# Altium footprint library TYCO THD.PcbLib: 146 footprints (part 3 of 11)
Each footprint in its own frame and in the unit in brackets; x right, y up, seen from the top. Pads: shape width x height; smd on the part's side, far side on the other; paste and mask are expansions set on the pad; w line width, h text height; cw(c..) or ccw(c..) is an arc to the next point about the centre after c.
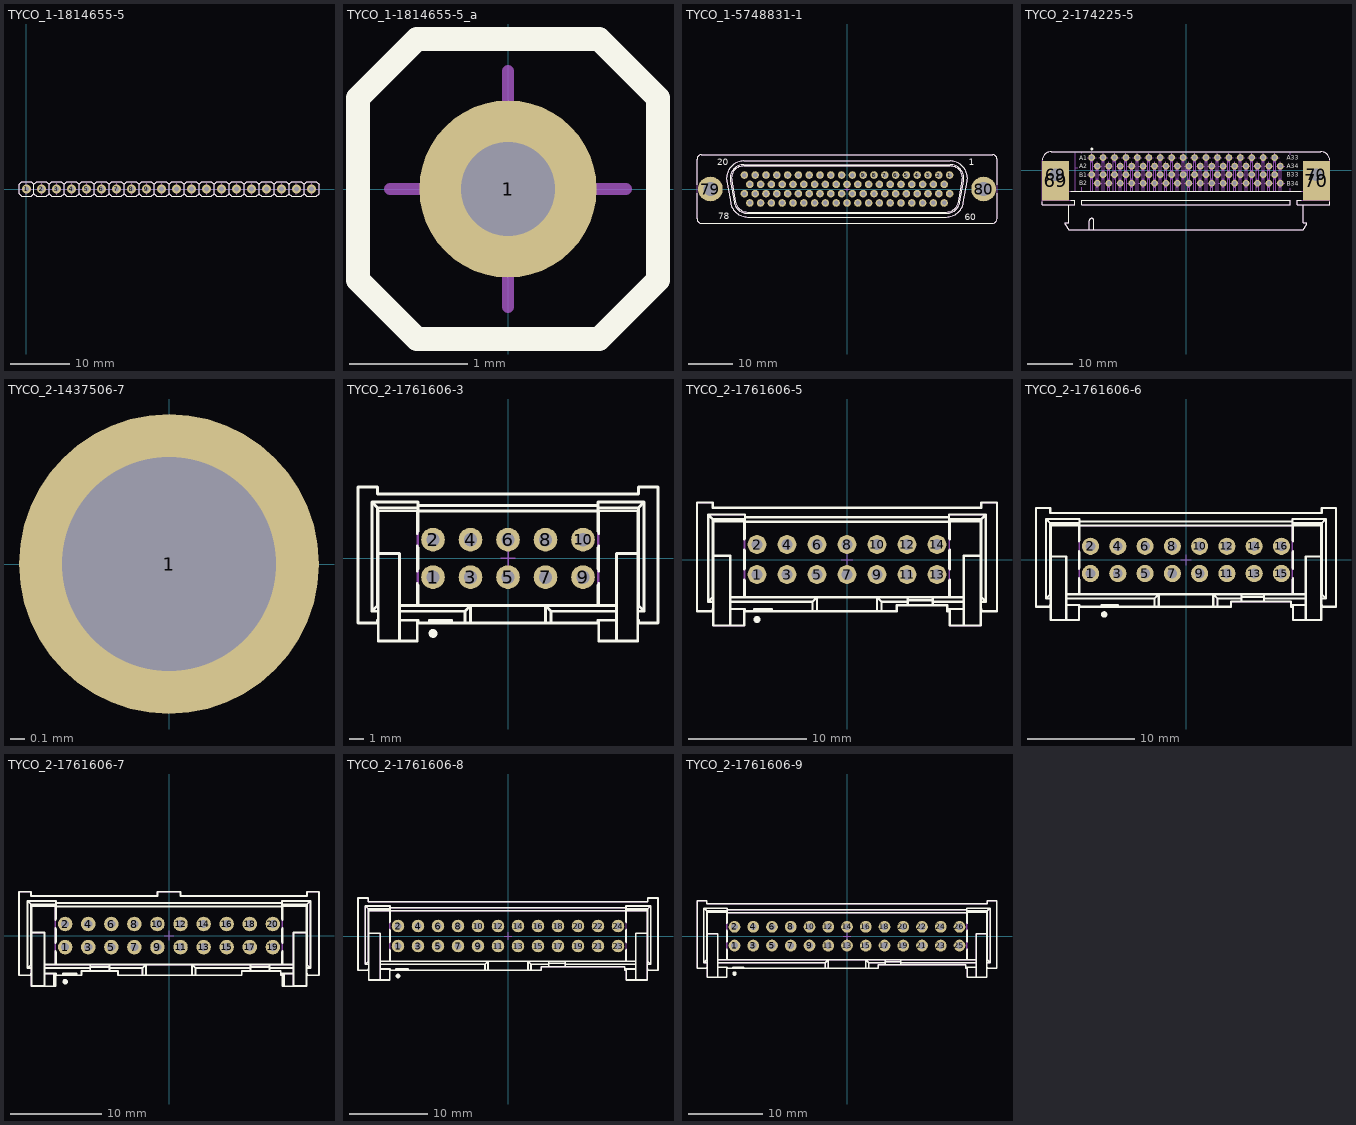
[diagram p2: the footprints below, top view; thin cyan lines are the x and y axes]

## TYCO_1-1814655-5 [mm] "20 Positions, Pitch 2.54mm, Width 2.54mm, Heigh 4.4mm, SIP Straight Socket"
height 4.4
pads (20):
  round 1.5 hole 0.8: 1(0,0) 2(2.54,0) 3(5.08,0) 4(7.62,0) 5(10.16,0) 6(12.7,0) 7(15.24,0) 8(17.78,0) 9(20.32,0) 10(22.86,0) 11(25.4,0) 12(27.94,0) 13(30.48,0) 14(33.02,0) 15(35.56,0) 16(38.1,0) 17(40.64,0) 18(43.18,0) 19(45.72,0) 20(48.26,0)
Top Overlay:
  lines w0.2: 1.27,-0.77 0.77,-1.27 -0.77,-1.27 -1.27,-0.77 -1.27,0.77 -0.77,1.27 0.77,1.27 1.27,0.77 ; 1.27,-0.77 1.77,-1.27 3.31,-1.27 3.81,-0.77 ; 1.27,-0.77 1.27,0.77 ; 1.27,0.77 1.77,1.27 3.31,1.27 3.81,0.77 ; 3.81,-0.77 4.31,-1.27 5.85,-1.27 6.35,-0.77 ; 3.81,-0.77 3.81,0.77 ; 3.81,0.77 4.31,1.27 5.85,1.27 6.35,0.77 ; 6.35,-0.77 6.85,-1.27 8.39,-1.27 8.89,-0.77 ; 6.35,-0.77 6.35,0.77 ; 6.35,0.77 6.85,1.27 8.39,1.27 8.89,0.77 ; 8.89,-0.77 9.39,-1.27 10.93,-1.27 11.43,-0.77 ; 8.89,-0.77 8.89,0.77 ; 8.89,0.77 9.39,1.27 10.93,1.27 11.43,0.77 ; 11.43,-0.77 11.93,-1.27 13.47,-1.27 13.97,-0.77 ; 11.43,-0.77 11.43,0.77 ; 11.43,0.77 11.93,1.27 13.47,1.27 13.97,0.77 ; 13.97,-0.77 14.47,-1.27 16.01,-1.27 16.51,-0.77 ; 13.97,-0.77 13.97,0.77 ; 13.97,0.77 14.47,1.27 16.01,1.27 16.51,0.77 ; 16.51,-0.77 17.01,-1.27 18.55,-1.27 19.05,-0.77 ; 16.51,-0.77 16.51,0.77 ; 16.51,0.77 17.01,1.27 18.55,1.27 19.05,0.77 ; 19.05,-0.77 19.55,-1.27 21.09,-1.27 21.59,-0.77 ; 19.05,-0.77 19.05,0.77 ; 19.05,0.77 19.55,1.27 21.09,1.27 21.59,0.77 ; 21.59,-0.77 22.09,-1.27 23.63,-1.27 24.13,-0.77 ; 21.59,-0.77 21.59,0.77 ; 21.59,0.77 22.09,1.27 23.63,1.27 24.13,0.77 ; 24.13,-0.77 24.63,-1.27 26.17,-1.27 26.67,-0.77 ; 24.13,-0.77 24.13,0.77 ; 24.13,0.77 24.63,1.27 26.17,1.27 26.67,0.77 ; 26.67,-0.77 26.67,0.77 ; 26.67,-0.77 27.17,-1.27 28.71,-1.27 29.21,-0.77 ; 26.67,0.77 27.17,1.27 28.71,1.27 29.21,0.77 ; 29.21,-0.77 29.21,0.77 ; 29.21,-0.77 29.71,-1.27 31.25,-1.27 31.75,-0.77 ; 29.21,0.77 29.71,1.27 31.25,1.27 31.75,0.77 ; 31.75,-0.77 31.75,0.77 ; 31.75,-0.77 32.25,-1.27 33.79,-1.27 34.29,-0.77 ; 31.75,0.77 32.25,1.27 33.79,1.27 34.29,0.77 ; 34.29,-0.77 34.79,-1.27 36.33,-1.27 36.83,-0.77 ; 34.29,-0.77 34.29,0.77 ; 34.29,0.77 34.79,1.27 36.33,1.27 36.83,0.77 ; 36.83,-0.77 37.33,-1.27 38.87,-1.27 39.37,-0.77 ; 36.83,-0.77 36.83,0.77 ; 36.83,0.77 37.33,1.27 38.87,1.27 39.37,0.77 ; 39.37,-0.77 39.37,0.77 ; 39.37,-0.77 39.87,-1.27 41.41,-1.27 41.91,-0.77 ; 39.37,0.77 39.87,1.27 41.41,1.27 41.91,0.77 ; 41.91,-0.77 42.41,-1.27 43.95,-1.27 44.45,-0.77 ; 41.91,-0.77 41.91,0.77 ; 41.91,0.77 42.41,1.27 43.95,1.27 44.45,0.77 ; 44.45,-0.77 44.45,0.77 ; 44.45,-0.77 44.95,-1.27 46.49,-1.27 46.99,-0.77 ; 44.45,0.77 44.95,1.27 46.49,1.27 46.99,0.77 ; 46.99,-0.77 46.99,0.77 ; 46.99,-0.77 47.49,-1.27 49.03,-1.27 49.53,-0.77 49.53,0.77 49.03,1.27 47.49,1.27 46.99,0.77
Mechanical 8:
  lines w0.1: -1,0 0,0 ; 0,-1 0,0 ; 0,1 0,0 ; 1,0 0,0 ; 1.54,0 2.54,0 ; 2.54,-1 2.54,0 ; 2.54,1 2.54,0 ; 3.54,0 2.54,0 ; 4.08,0 5.08,0 ; 5.08,-1 5.08,0 ; 5.08,1 5.08,0 ; 6.08,0 5.08,0 ; 6.62,0 7.62,0 ; 7.62,-1 7.62,0 ; 7.62,1 7.62,0 ; 8.62,0 7.62,0 ; 9.16,0 10.16,0 ; 10.16,-1 10.16,0 ; 10.16,1 10.16,0 ; 11.16,0 10.16,0 ; 11.7,0 12.7,0 ; 12.7,-1 12.7,0 ; 12.7,1 12.7,0 ; 13.7,0 12.7,0 ; 14.24,0 15.24,0 ; 15.24,-1 15.24,0 ; 15.24,1 15.24,0 ; 16.24,0 15.24,0 ; 16.78,0 17.78,0 ; 17.78,-1 17.78,0 ; 17.78,1 17.78,0 ; 18.78,0 17.78,0 ; 19.32,0 20.32,0 ; 20.32,-1 20.32,0 ; 20.32,1 20.32,0 ; 21.32,0 20.32,0 ; 21.86,0 22.86,0 ; 22.86,-1 22.86,0 ; 22.86,1 22.86,0 ; 23.86,0 22.86,0 ; 24.4,0 25.4,0 ; 25.4,-1 25.4,0 ; 25.4,1 25.4,0 ; 26.4,0 25.4,0 ; 26.94,0 27.94,0 ; 27.94,-1 27.94,0 ; 27.94,1 27.94,0 ; 28.94,0 27.94,0 ; 29.48,0 30.48,0 ; 30.48,-1 30.48,0 ; 30.48,1 30.48,0 ; 31.48,0 30.48,0 ; 32.02,0 33.02,0 ; 33.02,-1 33.02,0 ; 33.02,1 33.02,0 ; 34.02,0 33.02,0 ; 34.56,0 35.56,0 ; 35.56,-1 35.56,0 ; 35.56,1 35.56,0 ; 36.56,0 35.56,0 ; 37.1,0 38.1,0 ; 38.1,-1 38.1,0 ; 38.1,1 38.1,0 ; 39.1,0 38.1,0 ; 39.64,0 40.64,0 ; 40.64,-1 40.64,0 ; 40.64,1 40.64,0 ; 41.64,0 40.64,0 ; 42.18,0 43.18,0 ; 43.18,-1 43.18,0 ; 43.18,1 43.18,0 ; 44.18,0 43.18,0 ; 44.72,0 45.72,0 ; 45.72,-1 45.72,0 ; 45.72,1 45.72,0 ; 46.72,0 45.72,0 ; 47.26,0 48.26,0 ; 48.26,-1 48.26,0 ; 48.26,1 48.26,0 ; 49.26,0 48.26,0
Mechanical 14:
  lines w0.1: 1.27,-0.77 0.77,-1.27 -0.77,-1.27 -1.27,-0.77 -1.27,0.77 -0.77,1.27 0.77,1.27 1.27,0.77 ; 1.27,-0.77 1.77,-1.27 3.31,-1.27 3.81,-0.77 ; 1.27,-0.77 1.27,0.77 ; 1.27,0.77 1.77,1.27 3.31,1.27 3.81,0.77 ; 3.81,-0.77 4.31,-1.27 5.85,-1.27 6.35,-0.77 ; 3.81,-0.77 3.81,0.77 ; 3.81,0.77 4.31,1.27 5.85,1.27 6.35,0.77 ; 6.35,-0.77 6.85,-1.27 8.39,-1.27 8.89,-0.77 ; 6.35,-0.77 6.35,0.77 ; 6.35,0.77 6.85,1.27 8.39,1.27 8.89,0.77 ; 8.89,-0.77 9.39,-1.27 10.93,-1.27 11.43,-0.77 ; 8.89,-0.77 8.89,0.77 ; 8.89,0.77 9.39,1.27 10.93,1.27 11.43,0.77 ; 11.43,-0.77 11.93,-1.27 13.47,-1.27 13.97,-0.77 ; 11.43,-0.77 11.43,0.77 ; 11.43,0.77 11.93,1.27 13.47,1.27 13.97,0.77 ; 13.97,-0.77 14.47,-1.27 16.01,-1.27 16.51,-0.77 ; 13.97,-0.77 13.97,0.77 ; 13.97,0.77 14.47,1.27 16.01,1.27 16.51,0.77 ; 16.51,-0.77 17.01,-1.27 18.55,-1.27 19.05,-0.77 ; 16.51,-0.77 16.51,0.77 ; 16.51,0.77 17.01,1.27 18.55,1.27 19.05,0.77 ; 19.05,-0.77 19.55,-1.27 21.09,-1.27 21.59,-0.77 ; 19.05,-0.77 19.05,0.77 ; 19.05,0.77 19.55,1.27 21.09,1.27 21.59,0.77 ; 21.59,-0.77 22.09,-1.27 23.63,-1.27 24.13,-0.77 ; 21.59,-0.77 21.59,0.77 ; 21.59,0.77 22.09,1.27 23.63,1.27 24.13,0.77 ; 24.13,-0.77 24.63,-1.27 26.17,-1.27 26.67,-0.77 ; 24.13,-0.77 24.13,0.77 ; 24.13,0.77 24.63,1.27 26.17,1.27 26.67,0.77 ; 26.67,-0.77 26.67,0.77 ; 26.67,-0.77 27.17,-1.27 28.71,-1.27 29.21,-0.77 ; 26.67,0.77 27.17,1.27 28.71,1.27 29.21,0.77 ; 29.21,-0.77 29.21,0.77 ; 29.21,-0.77 29.71,-1.27 31.25,-1.27 31.75,-0.77 ; 29.21,0.77 29.71,1.27 31.25,1.27 31.75,0.77 ; 31.75,-0.77 31.75,0.77 ; 31.75,-0.77 32.25,-1.27 33.79,-1.27 34.29,-0.77 ; 31.75,0.77 32.25,1.27 33.79,1.27 34.29,0.77 ; 34.29,-0.77 34.79,-1.27 36.33,-1.27 36.83,-0.77 ; 34.29,-0.77 34.29,0.77 ; 34.29,0.77 34.79,1.27 36.33,1.27 36.83,0.77 ; 36.83,-0.77 37.33,-1.27 38.87,-1.27 39.37,-0.77 ; 36.83,-0.77 36.83,0.77 ; 36.83,0.77 37.33,1.27 38.87,1.27 39.37,0.77 ; 39.37,-0.77 39.37,0.77 ; 39.37,-0.77 39.87,-1.27 41.41,-1.27 41.91,-0.77 ; 39.37,0.77 39.87,1.27 41.41,1.27 41.91,0.77 ; 41.91,-0.77 42.41,-1.27 43.95,-1.27 44.45,-0.77 ; 41.91,-0.77 41.91,0.77 ; 41.91,0.77 42.41,1.27 43.95,1.27 44.45,0.77 ; 44.45,-0.77 44.45,0.77 ; 44.45,-0.77 44.95,-1.27 46.49,-1.27 46.99,-0.77 ; 44.45,0.77 44.95,1.27 46.49,1.27 46.99,0.77 ; 46.99,-0.77 46.99,0.77 ; 46.99,-0.77 47.49,-1.27 49.03,-1.27 49.53,-0.77 49.53,0.77 49.03,1.27 47.49,1.27 46.99,0.77
3D body "TYCO_1-1814655-5.stp": height 4.4, standoff -2.9, extent -1.27,-1.27 49.53,1.27

## TYCO_1-1814655-5_a [mm] "1 of 20 Positions, Pitch 2.54mm, Width 2.54mm, Heigh 4.4mm, SIP Straight Socket"
height 4.4
pads (1):
  round 1.5 hole 0.8: 1(0,0)
Top Overlay:
  lines w0.2: -1.27,-0.77 -1.27,0.77 -0.77,1.27 0.77,1.27 1.27,0.77 1.27,-0.77 0.77,-1.27 -0.77,-1.27 -1.27,-0.77
Mechanical 8:
  lines w0.1: -1,0 0,0 ; 0,-1 0,0 ; 0,1 0,0 ; 1,0 0,0
Mechanical 14:
  lines w0.1: -1.27,-0.77 -1.27,0.77 -0.77,1.27 0.77,1.27 1.27,0.77 1.27,-0.77 0.77,-1.27 -0.77,-1.27 -1.27,-0.77
3D body "TYCO_1-1814655-5_a.stp": height 4.4, standoff -2.9, extent -1.27,-1.27 1.27,1.27

## TYCO_1-5748831-1 [mm] "Straight D-SUB 78 Female Contacts, Shell Size 5, With Boardlock and Threaded Insert,(4-40 UNC), HD-22 Serie"
height 12.48
pads (80):
  round 1.7 hole 1: 1(22.914,3.12) 2(20.502,3.12) 3(18.09,3.12) 4(15.678,3.12) 5(13.266,3.12) 6(10.854,3.12) 7(8.442,3.12) 8(6.03,3.12) 9(3.618,3.12) 10(1.206,3.12) 11(-1.206,3.12) 12(-3.618,3.12) 13(-6.03,3.12) 14(-8.442,3.12) 15(-10.854,3.12) 16(-13.266,3.12) 17(-15.678,3.12) 18(-18.09,3.12) 19(-20.502,3.12) 20(-22.914,3.12) 21(21.708,1.04) 22(19.296,1.04) 23(16.884,1.04) 24(14.472,1.04) 25(12.06,1.04) 26(9.648,1.04) 27(7.236,1.04) 28(4.824,1.04) 29(2.412,1.04) 30(0,1.04) 31(-2.412,1.04) 32(-4.824,1.04) 33(-7.236,1.04) 34(-9.648,1.04) 35(-12.06,1.04) 36(-14.472,1.04) 37(-16.884,1.04) 38(-19.296,1.04) 39(-21.708,1.04) 40(22.914,-1.04) 41(20.502,-1.04) 42(18.09,-1.04) 43(15.678,-1.04) 44(13.266,-1.04) 45(10.854,-1.04) 46(8.442,-1.04) 47(6.03,-1.04) 48(3.618,-1.04) 49(1.206,-1.04) 50(-1.206,-1.04) 51(-3.618,-1.04) 52(-6.03,-1.04) 53(-8.442,-1.04) 54(-10.854,-1.04) 55(-13.266,-1.04) 56(-15.678,-1.04) 57(-18.09,-1.04) 58(-20.502,-1.04) 59(-22.914,-1.04) 60(21.708,-3.12) 61(19.296,-3.12) 62(16.884,-3.12) 63(14.472,-3.12) 64(12.06,-3.12) 65(9.648,-3.12) 66(7.236,-3.12) 67(4.824,-3.12) 68(2.412,-3.12) 69(0,-3.12) 70(-2.412,-3.12) 71(-4.824,-3.12) 72(-7.236,-3.12) 73(-9.648,-3.12) 74(-12.06,-3.12) 75(-14.472,-3.12) 76(-16.884,-3.12) 77(-19.296,-3.12) 78(-21.708,-3.12)
  round 5.5 hole 3.1: 79(-30.5,0) 80(30.5,0)
Top Overlay:
  lines w0.2: -33.5,-0.96 -33.5,-6.65 ccw(c-32.5,-6.65) -32.5,-7.65 32.5,-7.65 ccw(c32.5,-6.65) 33.5,-6.65 33.5,-0.96 ; -33.5,0.96 -33.5,6.65 cw(c-32.5,6.65) -32.5,7.65 32.5,7.65 cw(c32.5,6.65) 33.5,6.65 33.5,0.96 ; -26.913,2.402 cw(c-23.052,2.402) -23.052,6.263 23.052,6.263 cw(c23.052,2.402) 26.854,1.732 26.007,-3.072 cw(c22.205,-2.402) 22.205,-6.263 -22.205,-6.263 cw(c-22.205,-2.402) -26.007,-3.072 -26.913,2.402 ; -26.054,1.873 cw(c-23.052,2.402) -23.052,5.45 23.052,5.45 cw(c23.052,2.402) 26.054,1.873 25.219,-2.933 cw(c22.195,-2.376) 22.205,-5.45 -22.205,-5.45 cw(c-22.205,-2.402) -25.207,-2.931 -26.054,1.873 ; -25.758,1.925 cw(c-23.052,2.402) -23.052,5.15 23.052,5.15 cw(c23.052,2.402) 25.758,1.925 24.911,-2.879 cw(c22.205,-2.402) 22.205,-5.15 -22.205,-5.15 cw(c-22.205,-2.402) -24.911,-2.879 -25.758,1.925
  text "60" at 26.271,-6.927 h1.5
  text "1" at 27.146,5.263 h1.5
  text "78" at -28.704,-6.715 h1.5
  text "20" at -28.929,5.348 h1.5
Mechanical 8:
  drawing of 168 lines, arcs and shapes, not listed
Mechanical 14:
  drawing of 196 lines, arcs and shapes, not listed
  text "1" at 27.146,5.263 h1.5
  text "60" at 26.271,-6.927 h1.5
  text "78" at -28.704,-6.715 h1.5
  text "20" at -28.929,5.348 h1.5
3D body "TYCO_1-5748831-1.stp": height 12.1, standoff -3.18, extent -33.5,-7.65 33.5,7.65

## TYCO_2-174225-5 [mm] "68 contacts, AMPLIMITE .050\", Right Angled Header  Series 2 Type B (Threaded  M2.5)"
height 9.5
pads (72):
  rect 6x8.705 smd paste-3: 69(-28.955,-2.305) 70(28.955,-2.305)
  round 5.5 hole 2.8: 69(-28.955,-0.953) 70(28.955,-0.953)
  round 1.5 hole 0.9: A1(-20.955,2.858) A2(-19.685,0.953) A3(-18.415,2.858) A4(-17.145,0.953) A5(-15.875,2.858) A6(-14.605,0.953) A7(-13.335,2.858) A8(-12.065,0.952) A9(-10.795,2.858) A10(-9.525,0.953) A11(-8.255,2.858) A12(-6.985,0.953) A13(-5.715,2.858) A14(-4.445,0.953) A15(-3.175,2.858) A16(-1.905,0.953) A17(-0.635,2.858) A18(0.635,0.953) A19(1.905,2.858) A20(3.175,0.953) A21(4.445,2.858) A22(5.715,0.953) A23(6.985,2.858) A24(8.255,0.953) A25(9.525,2.858) A26(10.795,0.953) A27(12.065,2.858) A28(13.335,0.953) A29(14.605,2.858) A30(15.875,0.953) A31(17.145,2.858) A32(18.415,0.953) A33(19.685,2.858) A34(20.955,0.953) B1(-20.955,-0.953) B2(-19.685,-2.858) B3(-18.415,-0.953) B4(-17.145,-2.858) B5(-15.875,-0.953) B6(-14.605,-2.858) B7(-13.335,-0.953) B8(-12.065,-2.858) B9(-10.795,-0.953) B10(-9.525,-2.858) B11(-8.255,-0.953) B12(-6.985,-2.858) B13(-5.715,-0.953) B14(-4.445,-2.858) B15(-3.175,-0.953) B16(-1.905,-2.858) B17(-0.635,-0.953) B18(0.635,-2.858) B19(1.905,-0.953) B20(3.175,-2.858) B21(4.445,-0.953) B22(5.715,-2.858) B23(6.985,-0.953) B24(8.255,-2.858) B25(9.525,-0.953) B26(10.795,-2.858) B27(12.065,-0.953) B28(13.335,-2.858) B29(14.605,-0.953) B30(15.875,-2.858) B31(17.145,-0.953) B32(18.415,-2.858) B33(19.685,-0.953) B34(20.955,-2.858)
Top Overlay:
  circle w0.3: c-20.9,4.75 r0.15
  lines w0.2: -31.955,-7.007 -31.955,-7.658 -24.69,-7.658 -24.69,-6.658 -25.605,-6.658 ; -31.939,2.398 cw(c-29.955,2.143) -29.955,4.143 29.955,4.143 cw(c29.955,2.143) 31.939,2.398 ; -26.055,-7.658 -26.055,-11.658 -26.855,-11.658 -26.855,-11.957 -26.055,-13.157 26.055,-13.157 26.855,-11.957 26.855,-11.658 26.055,-11.658 26.055,-7.658 ; -25.605,-4.657 25.605,-4.657 ; -21.455,-13.157 -21.455,-11.158 cw(c-20.955,-11.158) -20.455,-11.158 -20.455,-13.157 ; 25.605,-6.658 24.69,-6.658 24.69,-7.658 31.955,-7.658 31.955,-7.007 ; -23.14,-7.658 -23.14,-6.658 23.14,-6.658 23.14,-7.658 -23.14,-7.658
  text "A34" at 22.4,0.485 h1
  text "B33" at 22.4,-1.415 h1
  text "B34" at 22.4,-3.365 h1
  text "A33" at 22.4,2.335 h1
  text "B2" at -23.65,-3.25 h1
  text "A1" at -23.65,2.25 h1
  text "A2" at -23.65,0.5 h1
  text "B1" at -23.65,-1.5 h1
Mechanical 8:
  drawing of 284 lines, arcs and shapes, not listed
Mechanical 14:
  drawing of 174 lines, arcs and shapes, not listed
  text "A34" at 22.4,0.485 h1.02
  text "B33" at 22.4,-1.415 h1.02
  text "B34" at 22.4,-3.365 h1.02
  text "A33" at 22.4,2.335 h1.02
  text "B2" at -23.65,-3.25 h1.02
  text "A1" at -23.65,2.25 h1.02
  text "A2" at -23.65,0.5 h1.02
  text "B1" at -23.65,-1.5 h1.02
3D body "TYCO_2-174225-5.stp": height 9.5, standoff -2.9, extent -31.955,-13.157 31.955,4.143

## TYCO_2-1437506-7 [mm] "HOLTITE Socket (Mating Pin Dia. Range 0.64 to 0.89mm)"
height 3.56
pads (1):
  round 2.1 hole 1.5: 1(0,0)
Mechanical 14:
  circle w0.1: c0,0 r0.737
  circle w0.1: c0,0.006 r0.368
3D body "TYCO_7-1437514-0.stp": height 0, standoff -3.45, extent -0.736,-0.736 0.737,0.737

## TYCO_2-1761606-3 [mm] "10 Contacts, Vertical Low Profile IDC Shrouded Header, with Long Eject Latch"
height 22.86
pads (10):
  round 1.6 hole 0.9: 1(-5.08,-1.27) 2(-5.08,1.27) 3(-2.54,-1.27) 4(-2.54,1.27) 5(0,-1.27) 6(0,1.27) 7(2.54,-1.27) 8(2.54,1.27) 9(5.08,-1.27) 10(5.08,1.27)
Top Overlay:
  circle w0.3: c-5.08,-5.08 r0.15
  lines w0.2: -8.788,-4.191 -8.839,-4.191 -8.839,-4.369 -10.16,-4.369 -10.16,4.826 -8.839,4.826 -8.839,4.369 8.839,4.369 8.839,4.826 10.16,4.826 10.16,-4.369 8.839,-4.369 8.839,-4.191 8.788,-4.191 ; -8.788,-3.581 -9.22,-3.581 ; -8.788,-3.2 -8.839,-3.2 ; -8.788,0.33 -7.341,0.33 -7.341,-5.588 ; -7.341,-4.191 -6.096,-4.191 -6.096,-4.369 6.096,-4.369 6.096,-4.191 7.341,-4.191 ; -7.341,-3.581 -2.921,-3.581 ; -7.341,-3.2 7.341,-3.2 ; -6.147,-4.191 -6.147,-5.588 -8.788,-5.588 -8.788,3.226 -6.147,3.226 -6.147,1.699 ; -6.147,-3.2 -6.147,-1.7 ; -6.147,-0.841 -6.147,0.84 ; -6.096,-3.2 -6.096,-1.809 ; -6.096,-0.731 -6.096,0.731 ; -6.096,1.809 -6.096,3.81 -9.22,3.81 ; -6.096,3.2 6.096,3.2 ; -6.096,3.429 -8.839,3.429 ; -6.096,3.581 6.096,3.581 ; -5.334,-4.369 -5.334,-4.191 -3.81,-4.191 -3.81,-4.369 ; -2.921,-4.369 -2.921,-3.581 ; -2.54,-4.369 -2.54,-3.2 -2.921,-3.581 ; 2.54,-4.369 2.54,-3.2 2.921,-3.581 ; 2.921,-4.369 2.921,-3.581 ; 6.096,-3.2 6.096,-1.809 ; 6.096,-0.731 6.096,0.731 ; 6.096,1.809 6.096,3.81 9.22,3.81 ; 6.096,3.429 8.839,3.429 ; 6.147,-4.191 6.147,-5.588 8.788,-5.588 8.788,3.226 6.147,3.226 6.147,1.699 ; 6.147,-3.2 6.147,-1.7 ; 6.147,-0.841 6.147,0.84 ; 7.341,-5.588 7.341,0.33 8.788,0.33 ; 7.341,-3.581 2.921,-3.581 ; 8.788,-3.581 9.22,-3.581 ; 8.788,-3.2 8.839,-3.2 ; -9.22,-3.581 -9.22,3.81 ; -9.22,-3.581 -8.839,-3.2 ; -9.22,3.81 -8.839,3.429 ; -8.839,-3.2 -8.839,3.429 ; 8.839,-3.2 8.839,3.429 ; 8.839,-3.2 9.22,-3.581 ; 8.839,3.429 9.22,3.81 ; 9.22,-3.581 9.22,3.81
Mechanical 8:
  lines w0.1: -5.58,-1.27 -5.08,-1.27 ; -5.58,1.27 -5.08,1.27 ; -5.08,-1.77 -5.08,-1.27 ; -5.08,-0.77 -5.08,-1.27 ; -5.08,0.77 -5.08,1.27 ; -5.08,1.77 -5.08,1.27 ; -4.58,-1.27 -5.08,-1.27 ; -4.58,1.27 -5.08,1.27 ; -3.04,-1.27 -2.54,-1.27 ; -3.04,1.27 -2.54,1.27 ; -2.54,-1.77 -2.54,-1.27 ; -2.54,-0.77 -2.54,-1.27 ; -2.54,0.77 -2.54,1.27 ; -2.54,1.77 -2.54,1.27 ; -2.04,-1.27 -2.54,-1.27 ; -2.04,1.27 -2.54,1.27 ; -0.5,-1.27 0,-1.27 ; -0.5,0 0,0 ; -0.5,1.27 0,1.27 ; 0,-1.77 0,-1.27 ; 0,-0.77 0,-1.27 ; 0,-0.5 0,0 ; 0,0.5 0,0 ; 0,0.77 0,1.27 ; 0,1.77 0,1.27 ; 0.5,-1.27 0,-1.27 ; 0.5,0 0,0 ; 0.5,1.27 0,1.27 ; 2.04,-1.27 2.54,-1.27 ; 2.04,1.27 2.54,1.27 ; 2.54,-1.77 2.54,-1.27 ; 2.54,-0.77 2.54,-1.27 ; 2.54,0.77 2.54,1.27 ; 2.54,1.77 2.54,1.27 ; 3.04,-1.27 2.54,-1.27 ; 3.04,1.27 2.54,1.27 ; 4.58,-1.27 5.08,-1.27 ; 4.58,1.27 5.08,1.27 ; 5.08,-1.77 5.08,-1.27 ; 5.08,-0.77 5.08,-1.27 ; 5.08,0.77 5.08,1.27 ; 5.08,1.77 5.08,1.27 ; 5.58,-1.27 5.08,-1.27 ; 5.58,1.27 5.08,1.27
Mechanical 14:
  lines w0.1: -8.788,-4.191 -8.839,-4.191 -8.839,-4.369 -10.16,-4.369 -10.16,4.826 -8.839,4.826 -8.839,4.369 8.839,4.369 8.839,4.826 10.16,4.826 10.16,-4.369 8.839,-4.369 8.839,-4.191 8.788,-4.191 ; -8.788,-3.581 -9.22,-3.581 ; -8.788,-3.2 -8.839,-3.2 ; -8.788,0.33 -7.341,0.33 -7.341,-5.588 ; -7.341,-4.191 -6.096,-4.191 -6.096,-4.369 6.096,-4.369 6.096,-4.191 7.341,-4.191 ; -7.341,-3.581 -2.921,-3.581 ; -7.341,-3.2 7.341,-3.2 ; -6.147,-4.191 -6.147,-5.588 -8.788,-5.588 -8.788,3.226 -6.147,3.226 -6.147,-3.2 ; -6.096,-3.2 -6.096,3.81 -9.22,3.81 ; -6.096,3.2 6.096,3.2 ; -6.096,3.429 -8.839,3.429 ; -6.096,3.581 6.096,3.581 ; -5.334,-4.369 -5.334,-4.191 -3.81,-4.191 -3.81,-4.369 ; -2.921,-4.369 -2.921,-3.581 ; -2.54,-4.369 -2.54,-3.2 -2.921,-3.581 ; 2.54,-4.369 2.54,-3.2 2.921,-3.581 ; 2.921,-4.369 2.921,-3.581 ; 6.096,-3.2 6.096,3.81 9.22,3.81 ; 6.096,3.429 8.839,3.429 ; 6.147,-4.191 6.147,-5.588 8.788,-5.588 8.788,3.226 6.147,3.226 6.147,-3.2 ; 7.341,-5.588 7.341,0.33 8.788,0.33 ; 7.341,-3.581 2.921,-3.581 ; 8.788,-3.581 9.22,-3.581 ; 8.788,-3.2 8.839,-3.2 ; -9.22,-3.581 -9.22,3.81 ; -9.22,-3.581 -8.839,-3.2 ; -9.22,3.81 -8.839,3.429 ; -8.839,-3.2 -8.839,3.429 ; 8.839,-3.2 8.839,3.429 ; 8.839,-3.2 9.22,-3.581 ; 8.839,3.429 9.22,3.81 ; 9.22,-3.581 9.22,3.81 ; -5.398,-1.588 -5.398,-0.953 -4.763,-0.953 -4.763,-1.588 -5.398,-1.588 ; -5.398,0.952 -4.763,0.952 -4.763,1.587 -5.398,1.587 -5.398,0.952 ; -2.858,-1.588 -2.858,-0.953 -2.223,-0.953 -2.223,-1.588 -2.858,-1.588 ; -2.858,0.952 -2.223,0.952 -2.223,1.587 -2.858,1.587 -2.858,0.952 ; -0.318,-1.588 -0.318,-0.953 0.317,-0.953 0.317,-1.588 -0.318,-1.588 ; -0.318,0.952 0.317,0.952 0.317,1.587 -0.318,1.587 -0.318,0.952 ; 2.222,-1.588 2.222,-0.953 2.857,-0.953 2.857,-1.588 2.222,-1.588 ; 2.222,0.952 2.857,0.952 2.857,1.587 2.222,1.587 2.222,0.952 ; 4.762,-1.588 4.762,-0.953 5.397,-0.953 5.397,-1.588 4.762,-1.588 ; 4.762,0.952 5.397,0.952 5.397,1.587 4.762,1.587 4.762,0.952
3D body "TYCO_2-1761606-3.stp": height 22.55, standoff -2.59, extent -10.16,-5.588 10.16,4.826

## TYCO_2-1761606-5 [mm] "14 Contacts, Vertical Low Profile IDC Shrouded Header, with Long Eject Latch"
height 22.86
pads (14):
  round 1.6 hole 0.9: 1(-7.62,-1.27) 2(-7.62,1.27) 3(-5.08,-1.27) 4(-5.08,1.27) 5(-2.54,-1.27) 6(-2.54,1.27) 7(0,-1.27) 8(0,1.27) 9(2.54,-1.27) 10(2.54,1.27) 11(5.08,-1.27) 12(5.08,1.27) 13(7.62,-1.27) 14(7.62,1.27)
Top Overlay:
  circle w0.3: c-7.62,-5.08 r0.15
  lines w0.2: -11.328,-4.191 -11.379,-4.191 -11.379,-4.369 -12.7,-4.369 -12.7,4.826 -11.379,4.826 -11.379,4.369 11.379,4.369 11.379,4.826 12.7,4.826 12.7,-4.369 11.379,-4.369 11.379,-4.191 11.328,-4.191 ; -11.328,-3.581 -11.76,-3.581 ; -11.328,-3.2 -11.379,-3.2 ; -11.328,0.33 -9.881,0.33 -9.881,-5.588 ; -9.881,-4.191 -8.636,-4.191 -8.636,-4.369 4.204,-4.369 4.204,-3.886 8.496,-3.886 8.496,-4.369 8.636,-4.369 8.636,-4.191 9.881,-4.191 ; -9.881,-3.581 -2.921,-3.581 ; -9.881,-3.2 9.881,-3.2 ; -8.687,-4.191 -8.687,-5.588 -11.328,-5.588 -11.328,3.226 -8.687,3.226 -8.687,1.699 ; -8.687,-3.2 -8.687,-1.699 ; -8.687,-0.841 -8.687,0.841 ; -8.636,-3.2 -8.636,-1.809 ; -8.636,-0.731 -8.636,0.731 ; -8.636,1.809 -8.636,3.81 -11.76,3.81 ; -8.636,3.2 8.636,3.2 ; -8.636,3.429 -11.379,3.429 ; -8.636,3.581 8.636,3.581 ; -7.874,-4.369 -7.874,-4.191 -6.35,-4.191 -6.35,-4.369 ; -2.921,-4.369 -2.921,-3.581 ; -2.54,-4.369 -2.54,-3.2 -2.921,-3.581 ; 2.54,-4.369 2.54,-3.2 2.921,-3.581 ; 2.921,-4.369 2.921,-3.581 ; 5.156,-3.886 5.156,-3.2 ; 5.156,-3.581 2.921,-3.581 ; 5.156,-3.454 7.264,-3.454 ; 7.264,-3.886 7.264,-3.2 ; 7.264,-3.581 9.881,-3.581 ; 8.636,-3.2 8.636,-1.809 ; 8.636,-0.731 8.636,0.731 ; 8.636,1.809 8.636,3.81 11.76,3.81 ; 8.636,3.429 11.379,3.429 ; 8.687,-4.191 8.687,-5.588 11.328,-5.588 11.328,3.226 8.687,3.226 8.687,1.699 ; 8.687,-3.2 8.687,-1.699 ; 8.687,-0.841 8.687,0.841 ; 9.881,-5.588 9.881,0.33 11.328,0.33 ; 11.328,-3.581 11.76,-3.581 ; 11.328,-3.2 11.379,-3.2 ; -11.76,-3.581 -11.379,-3.2 ; -11.76,-3.581 -11.76,3.81 ; -11.76,3.81 -11.379,3.429 ; -11.379,-3.2 -11.379,3.429 ; 11.379,-3.2 11.379,3.429 ; 11.379,-3.2 11.76,-3.581 ; 11.379,3.429 11.76,3.81 ; 11.76,-3.581 11.76,3.81
Mechanical 8:
  lines w0.1: -8.12,-1.27 -7.62,-1.27 ; -8.12,1.27 -7.62,1.27 ; -7.62,-1.77 -7.62,-1.27 ; -7.62,-0.77 -7.62,-1.27 ; -7.62,0.77 -7.62,1.27 ; -7.62,1.77 -7.62,1.27 ; -7.12,-1.27 -7.62,-1.27 ; -7.12,1.27 -7.62,1.27 ; -5.58,-1.27 -5.08,-1.27 ; -5.58,1.27 -5.08,1.27 ; -5.08,-1.77 -5.08,-1.27 ; -5.08,-0.77 -5.08,-1.27 ; -5.08,0.77 -5.08,1.27 ; -5.08,1.77 -5.08,1.27 ; -4.58,-1.27 -5.08,-1.27 ; -4.58,1.27 -5.08,1.27 ; -3.04,-1.27 -2.54,-1.27 ; -3.04,1.27 -2.54,1.27 ; -2.54,-1.77 -2.54,-1.27 ; -2.54,-0.77 -2.54,-1.27 ; -2.54,0.77 -2.54,1.27 ; -2.54,1.77 -2.54,1.27 ; -2.04,-1.27 -2.54,-1.27 ; -2.04,1.27 -2.54,1.27 ; -0.5,-1.27 0,-1.27 ; -0.5,0 0,0 ; -0.5,1.27 0,1.27 ; 0,-1.77 0,-1.27 ; 0,-0.77 0,-1.27 ; 0,-0.5 0,0 ; 0,0.5 0,0 ; 0,0.77 0,1.27 ; 0,1.77 0,1.27 ; 0.5,-1.27 0,-1.27 ; 0.5,0 0,0 ; 0.5,1.27 0,1.27 ; 2.04,-1.27 2.54,-1.27 ; 2.04,1.27 2.54,1.27 ; 2.54,-1.77 2.54,-1.27 ; 2.54,-0.77 2.54,-1.27 ; 2.54,0.77 2.54,1.27 ; 2.54,1.77 2.54,1.27 ; 3.04,-1.27 2.54,-1.27 ; 3.04,1.27 2.54,1.27 ; 4.58,-1.27 5.08,-1.27 ; 4.58,1.27 5.08,1.27 ; 5.08,-1.77 5.08,-1.27 ; 5.08,-0.77 5.08,-1.27 ; 5.08,0.77 5.08,1.27 ; 5.08,1.77 5.08,1.27 ; 5.58,-1.27 5.08,-1.27 ; 5.58,1.27 5.08,1.27 ; 7.12,-1.27 7.62,-1.27 ; 7.12,1.27 7.62,1.27 ; 7.62,-1.77 7.62,-1.27 ; 7.62,-0.77 7.62,-1.27 ; 7.62,0.77 7.62,1.27 ; 7.62,1.77 7.62,1.27 ; 8.12,-1.27 7.62,-1.27 ; 8.12,1.27 7.62,1.27